# Altium footprint library ICs And Semiconductors THD.PcbLib: 507 footprints (part 6 of 32)
Each footprint in its own frame and in the unit in brackets; x right, y up, seen from the top. Pads: shape width x height; smd on the part's side, far side on the other; paste and mask are expansions set on the pad; w line width, h text height; cw(c..) or ccw(c..) is an arc to the next point about the centre after c.
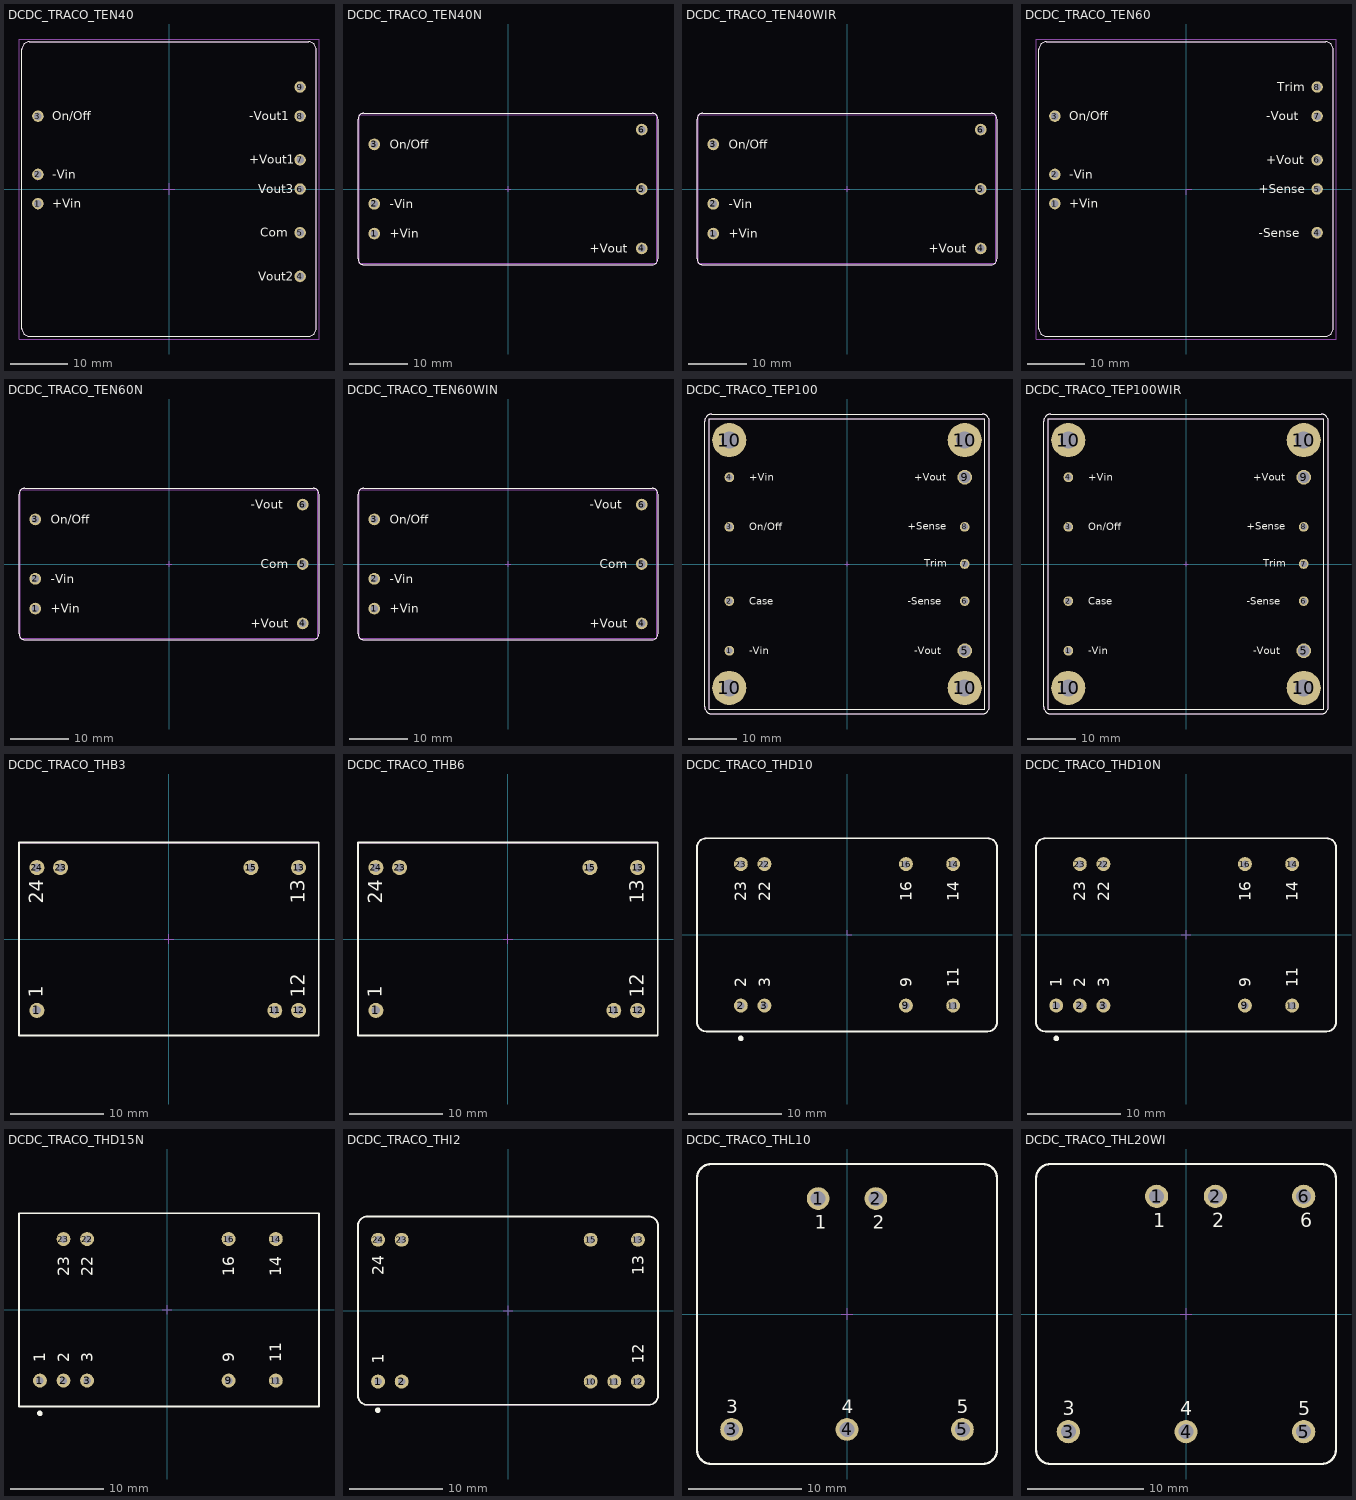
[diagram p5: the footprints below, top view; thin cyan lines are the x and y axes]

## DCDC_TRACO_TEN40 [mm] "TEN 40 Series , Body 51.3x51.3mm"
height 10.7
pads (9):
  round 2 hole 1.3: 1(-22.85,-2.54) 2(-22.85,2.54) 3(-22.85,12.7) 4(22.85,-15.24) 5(22.85,-7.62) 6(22.85,0) 7(22.85,5.08) 8(22.85,12.7) 9(22.85,17.78)
Top Overlay:
  lines w0.2: -25.65,-24.4 ccw(c-24.4,-24.4) -24.4,-25.65 24.4,-25.65 ccw(c24.4,-24.4) 25.65,-24.4 25.65,24.4 ccw(c24.4,24.4) 24.4,25.65 -24.4,25.65 ccw(c-24.4,24.4) -25.65,24.4 -25.65,-24.4
  text "+Vout1" at 13.95,4.4 h1.5
  text "On/Off" at -20.31,11.95 h1.5
  text "-Vin" at -20.31,1.79 h1.5
  text "+Vin" at -20.31,-3.29 h1.5
  text "Vout3" at 15.6,-0.7 h1.5
  text "Com" at 15.9,-8.3 h1.5
  text "-Vout1" at 13.96,11.95 h1.5
  text "Vout2" at 15.6,-16 h1.5
Notvisible:
  circle w0.05: c22.85,-15.24 r0.5
  circle w0.05: c-22.85,-2.54 r0.5
  circle w0.05: c-22.85,2.54 r0.5
  circle w0.05: c-22.85,12.7 r0.5
  circle w0.05: c22.85,17.78 r0.5
  circle w0.05: c22.85,12.7 r0.5
  circle w0.05: c22.85,5.08 r0.5
  circle w0.05: c22.85,0 r0.5
  circle w0.05: c22.85,-7.62 r0.5
  lines w0.05: -22.85,-3.54 -22.85,-2.54 -21.85,-2.54 ; -22.85,1.54 -22.85,2.54 -21.85,2.54 ; -22.85,11.7 -22.85,12.7 -21.85,12.7 ; 22.85,-16.24 22.85,-15.24 23.85,-15.24 ; 22.85,-8.62 22.85,-7.62 23.85,-7.62 ; 22.85,-1 22.85,0 23.85,0 ; 22.85,4.08 22.85,5.08 23.85,5.08 ; 22.85,11.7 22.85,12.7 23.85,12.7 ; 22.85,16.78 22.85,17.78 23.85,17.78
  lines w0.1: -1,0 0,0 ; 0,-1 0,0 ; 0,1 0,0 ; 1,0 0,0
  text "4" at 19.45,-15.74 h1
  text "5" at 19.479,-8.12 h1
  text "6" at 19.505,-0.5 h1
  text "7" at 19.5,4.58 h1
  text "9" at 19.483,17.28 h1
  text "8" at 19.5,12.2 h1
  text "3" at -20.221,12.2 h1
  text "2" at -20.217,2.04 h1
  text "1" at -20.1,-3.04 h1
Mechanical 14:
  lines w0.1: -25.65,-24.4 ccw(c-24.4,-24.4) -24.4,-25.65 24.4,-25.65 ccw(c24.4,-24.4) 25.65,-24.4 25.65,24.4 ccw(c24.4,24.4) 24.4,25.65 -24.4,25.65 ccw(c-24.4,24.4) -25.65,24.4 -25.65,-24.4
Mechanical 15:
  lines w0.05: -26.15,-26.15 -26.15,26.15 26.15,26.15 26.15,-26.15 -26.15,-26.15
3D body "DCDC_TRACO_TEN40.stp": height 10.7, standoff -3.8, extent -25.65,-25.65 25.65,25.65

## DCDC_TRACO_TEN40N [mm] "TEN 40N Series , Body 50.8x  25.4mm"
height 10.45
pads (6):
  round 2 hole 1.3: 1(-22.86,-7.62) 2(-22.86,-2.54) 3(-22.86,7.62) 4(22.86,-10.16) 5(22.86,0) 6(22.86,10.16)
Top Overlay:
  lines w0.2: -25.65,-11.95 ccw(c-24.65,-11.95) -24.65,-12.95 24.65,-12.95 ccw(c24.65,-11.95) 25.65,-11.95 25.65,11.95 ccw(c24.65,11.95) 24.65,12.95 -24.65,12.95 ccw(c-24.65,11.95) -25.65,11.95 -25.65,-11.95
  text "+Vin" at -20.193,-8.37 h1.5
  text "-Vin" at -20.193,-3.29 h1.5
  text "On/Off" at -20.193,6.87 h1.5
  text "+Vout" at 13.999,-10.91 h1.5
Notvisible:
  lines w0.1: -23.36,-7.62 -22.86,-7.62 ; -23.36,-2.54 -22.86,-2.54 ; -23.36,7.62 -22.86,7.62 ; -22.86,-8.12 -22.86,-7.62 ; -22.86,-7.12 -22.86,-7.62 ; -22.86,-3.04 -22.86,-2.54 ; -22.86,-2.04 -22.86,-2.54 ; -22.86,7.12 -22.86,7.62 ; -22.86,8.12 -22.86,7.62 ; -22.36,-7.62 -22.86,-7.62 ; -22.36,-2.54 -22.86,-2.54 ; -22.36,7.62 -22.86,7.62 ; -0.5,0 0,0 ; 0,-0.5 0,0 ; 0,0.5 0,0 ; 0.5,0 0,0 ; 22.36,-10.16 22.86,-10.16 ; 22.36,0 22.86,0 ; 22.36,10.16 22.86,10.16 ; 22.86,-10.66 22.86,-10.16 ; 22.86,-9.66 22.86,-10.16 ; 22.86,-0.5 22.86,0 ; 22.86,0.5 22.86,0 ; 22.86,9.66 22.86,10.16 ; 22.86,10.66 22.86,10.16 ; 23.36,-10.16 22.86,-10.16 ; 23.36,0 22.86,0 ; 23.36,10.16 22.86,10.16 ; -25.4,-12.7 -25.4,12.7 25.4,12.7 25.4,-12.7 -25.4,-12.7
Mechanical 14:
  lines w0.1: -25.65,-11.95 ccw(c-24.65,-11.95) -24.65,-12.95 24.65,-12.95 ccw(c24.65,-11.95) 25.65,-11.95 25.65,11.95 ccw(c24.65,11.95) 24.65,12.95 -24.65,12.95 ccw(c-24.65,11.95) -25.65,11.95 -25.65,-11.95
3D body "DCDC_TRACO_TEN40N.stp": height 10.45, standoff -3.8, extent -25.65,-12.95 25.65,12.95

## DCDC_TRACO_TEN40WIR [mm] "TEN 40WIR Series , Body 50.8 x  25.4mm"
height 10.7
pads (6):
  round 2 hole 1.3: 1(-22.86,-7.62) 2(-22.86,-2.54) 3(-22.86,7.62) 4(22.86,-10.16) 5(22.86,0) 6(22.86,10.16)
Top Overlay:
  lines w0.2: -25.65,-11.95 ccw(c-24.65,-11.95) -24.65,-12.95 24.65,-12.95 ccw(c24.65,-11.95) 25.65,-11.95 25.65,11.95 ccw(c24.65,11.95) 24.65,12.95 -24.65,12.95 ccw(c-24.65,11.95) -25.65,11.95 -25.65,-11.95
  text "+Vout" at 13.999,-10.91 h1.5
  text "On/Off" at -20.193,6.87 h1.5
  text "-Vin" at -20.193,-3.29 h1.5
  text "+Vin" at -20.193,-8.37 h1.5
Notvisible:
  lines w0.1: -23.36,-7.62 -22.86,-7.62 ; -23.36,-2.54 -22.86,-2.54 ; -23.36,7.62 -22.86,7.62 ; -22.86,-8.12 -22.86,-7.62 ; -22.86,-7.12 -22.86,-7.62 ; -22.86,-3.04 -22.86,-2.54 ; -22.86,-2.04 -22.86,-2.54 ; -22.86,7.12 -22.86,7.62 ; -22.86,8.12 -22.86,7.62 ; -22.36,-7.62 -22.86,-7.62 ; -22.36,-2.54 -22.86,-2.54 ; -22.36,7.62 -22.86,7.62 ; -0.5,0 0,0 ; 0,-0.5 0,0 ; 0,0.5 0,0 ; 0.5,0 0,0 ; 22.36,-10.16 22.86,-10.16 ; 22.36,0 22.86,0 ; 22.36,10.16 22.86,10.16 ; 22.86,-10.66 22.86,-10.16 ; 22.86,-9.66 22.86,-10.16 ; 22.86,-0.5 22.86,0 ; 22.86,0.5 22.86,0 ; 22.86,9.66 22.86,10.16 ; 22.86,10.66 22.86,10.16 ; 23.36,-10.16 22.86,-10.16 ; 23.36,0 22.86,0 ; 23.36,10.16 22.86,10.16 ; -25.4,-12.7 25.4,-12.7 25.4,12.7 -25.4,12.7 -25.4,-12.7
Mechanical 14:
  lines w0.1: -25.65,-11.95 ccw(c-24.65,-11.95) -24.65,-12.95 24.65,-12.95 ccw(c24.65,-11.95) 25.65,-11.95 25.65,11.95 ccw(c24.65,11.95) 24.65,12.95 -24.65,12.95 ccw(c-24.65,11.95) -25.65,11.95 -25.65,-11.95
3D body "DCDC_TRACO_TEN40WIR.stp": height 10.45, standoff -3.8, extent -25.65,-12.95 25.65,12.95

## DCDC_TRACO_TEN60 [mm] "TEN 60 Series , Body 51.3x51.3mm"
height 10.7
pads (8):
  round 2 hole 1.3: 1(-22.86,-2.54) 2(-22.86,2.54) 3(-22.86,12.7) 4(22.86,-7.62) 5(22.86,0) 6(22.86,5.08) 7(22.86,12.7) 8(22.86,17.78)
Top Overlay:
  lines w0.2: -25.65,-24.4 ccw(c-24.4,-24.4) -24.4,-25.65 24.4,-25.65 ccw(c24.4,-24.4) 25.65,-24.4 25.65,24.4 ccw(c24.4,24.4) 24.4,25.65 -24.4,25.65 ccw(c-24.4,24.4) -25.65,24.4 -25.65,-24.4
  text "Trim" at 15.875,17.03 h1.5
  text "-Vout" at 13.97,11.95 h1.5
  text "-Sense" at 12.7,-8.37 h1.5
  text "+Sense" at 12.7,-0.75 h1.5
  text "+Vin" at -20.32,-3.29 h1.5
  text "-Vin" at -20.32,1.79 h1.5
  text "On/Off" at -20.32,11.95 h1.5
  text "+Vout" at 13.97,4.33 h1.5
Notvisible:
  lines w0.1: 0,-1 0,0 1,0
Mechanical 14:
  lines w0.1: -25.65,-24.4 ccw(c-24.4,-24.4) -24.4,-25.65 24.4,-25.65 ccw(c24.4,-24.4) 25.65,-24.4 25.65,24.4 ccw(c24.4,24.4) 24.4,25.65 -24.4,25.65 ccw(c-24.4,24.4) -25.65,24.4 -25.65,-24.4
Mechanical 15:
  lines w0.05: -26.15,-26.15 26.15,-26.15 26.15,26.15 -26.15,26.15 -26.15,-26.15
3D body "DCDC_TRACO_TEN60.stp": height 10.7, standoff -3.8, extent -25.65,-25.65 25.65,25.65

## DCDC_TRACO_TEN60N [mm] "TEN 60N Series , Body 51.3x25.9mm"
height 10.7
pads (6):
  round 2 hole 1.3: 1(-22.86,-7.62) 2(-22.86,-2.54) 3(-22.86,7.62) 4(22.86,-10.16) 5(22.86,0) 6(22.86,10.16)
Top Overlay:
  lines w0.2: -25.65,-11.95 ccw(c-24.65,-11.95) -24.65,-12.95 24.65,-12.95 ccw(c24.65,-11.95) 25.65,-11.95 25.65,11.95 ccw(c24.65,11.95) 24.65,12.95 -24.65,12.95 ccw(c-24.65,11.95) -25.65,11.95 -25.65,-11.95
  text "Com" at 15.699,-0.75 h1.5
  text "+Vin" at -20.193,-8.37 h1.5
  text "-Vin" at -20.193,-3.29 h1.5
  text "On/Off" at -20.193,6.87 h1.5
  text "+Vout" at 13.999,-10.91 h1.5
  text "-Vout" at 13.999,9.41 h1.5
Notvisible:
  lines w0.1: -23.36,-7.62 -22.86,-7.62 ; -23.36,-2.54 -22.86,-2.54 ; -23.36,7.62 -22.86,7.62 ; -22.86,-8.12 -22.86,-7.62 ; -22.86,-7.12 -22.86,-7.62 ; -22.86,-3.04 -22.86,-2.54 ; -22.86,-2.04 -22.86,-2.54 ; -22.86,7.12 -22.86,7.62 ; -22.86,8.12 -22.86,7.62 ; -22.36,-7.62 -22.86,-7.62 ; -22.36,-2.54 -22.86,-2.54 ; -22.36,7.62 -22.86,7.62 ; -0.5,0 0,0 ; 0,-0.5 0,0 ; 0,0.5 0,0 ; 0.5,0 0,0 ; 22.36,-10.16 22.86,-10.16 ; 22.36,0 22.86,0 ; 22.36,10.16 22.86,10.16 ; 22.86,-10.66 22.86,-10.16 ; 22.86,-9.66 22.86,-10.16 ; 22.86,-0.5 22.86,0 ; 22.86,0.5 22.86,0 ; 22.86,9.66 22.86,10.16 ; 22.86,10.66 22.86,10.16 ; 23.36,-10.16 22.86,-10.16 ; 23.36,0 22.86,0 ; 23.36,10.16 22.86,10.16 ; -25.4,-12.7 -25.4,12.7 25.4,12.7 25.4,-12.7 -25.4,-12.7
Mechanical 14:
  lines w0.1: -25.65,-11.95 ccw(c-24.65,-11.95) -24.65,-12.95 24.65,-12.95 ccw(c24.65,-11.95) 25.65,-11.95 25.65,11.95 ccw(c24.65,11.95) 24.65,12.95 -24.65,12.95 ccw(c-24.65,11.95) -25.65,11.95 -25.65,-11.95
3D body "DCDC_TRACO_TEN60N.stp": height 10.7, standoff -3.8, extent -25.65,-12.95 25.65,12.95

## DCDC_TRACO_TEN60WIN [mm] "TEN 60N Series , Body 51.3x25.9mm"
height 10.7
pads (6):
  round 2 hole 1.3: 1(-22.86,-7.62) 2(-22.86,-2.54) 3(-22.86,7.62) 4(22.86,-10.16) 5(22.86,0) 6(22.86,10.16)
Top Overlay:
  lines w0.2: -25.65,-11.95 ccw(c-24.65,-11.95) -24.65,-12.95 24.65,-12.95 ccw(c24.65,-11.95) 25.65,-11.95 25.65,11.95 ccw(c24.65,11.95) 24.65,12.95 -24.65,12.95 ccw(c-24.65,11.95) -25.65,11.95 -25.65,-11.95
  text "Com" at 15.699,-0.75 h1.5
  text "+Vin" at -20.193,-8.37 h1.5
  text "-Vin" at -20.193,-3.29 h1.5
  text "On/Off" at -20.193,6.87 h1.5
  text "+Vout" at 13.999,-10.91 h1.5
  text "-Vout" at 13.999,9.41 h1.5
Notvisible:
  lines w0.1: -23.36,-7.62 -22.86,-7.62 ; -23.36,-2.54 -22.86,-2.54 ; -23.36,7.62 -22.86,7.62 ; -22.86,-8.12 -22.86,-7.62 ; -22.86,-7.12 -22.86,-7.62 ; -22.86,-3.04 -22.86,-2.54 ; -22.86,-2.04 -22.86,-2.54 ; -22.86,7.12 -22.86,7.62 ; -22.86,8.12 -22.86,7.62 ; -22.36,-7.62 -22.86,-7.62 ; -22.36,-2.54 -22.86,-2.54 ; -22.36,7.62 -22.86,7.62 ; -0.5,0 0,0 ; 0,-0.5 0,0 ; 0,0.5 0,0 ; 0.5,0 0,0 ; 22.36,-10.16 22.86,-10.16 ; 22.36,0 22.86,0 ; 22.36,10.16 22.86,10.16 ; 22.86,-10.66 22.86,-10.16 ; 22.86,-9.66 22.86,-10.16 ; 22.86,-0.5 22.86,0 ; 22.86,0.5 22.86,0 ; 22.86,9.66 22.86,10.16 ; 22.86,10.66 22.86,10.16 ; 23.36,-10.16 22.86,-10.16 ; 23.36,0 22.86,0 ; 23.36,10.16 22.86,10.16 ; -25.4,-12.7 -25.4,12.7 25.4,12.7 25.4,-12.7 -25.4,-12.7
Mechanical 14:
  lines w0.1: -25.65,-11.95 ccw(c-24.65,-11.95) -24.65,-12.95 24.65,-12.95 ccw(c24.65,-11.95) 25.65,-11.95 25.65,11.95 ccw(c24.65,11.95) 24.65,12.95 -24.65,12.95 ccw(c-24.65,11.95) -25.65,11.95 -25.65,-11.95
3D body "DCDC_TRACO_TEN60N.stp": height 10.7, standoff -3.8, extent -25.65,-12.95 25.65,12.95

## DCDC_TRACO_TEP100 [mm] "TEP 100 Series, Single Output DC/DC Converter,  Body 61.5x58.2mm"
height 13.2
pads (13):
  round 2 hole 1.3: 1(-24.13,-17.78) 2(-24.13,-7.62) 3(-24.13,7.62) 4(-24.13,17.78) 6(24.13,-7.62) 7(24.13,0) 8(24.13,7.62)
  round 3 hole 2.3: 5(24.13,-17.78) 9(24.13,17.78)
  round 7 hole 3.5: 10(-24.13,-25.4) 10(-24.13,25.4) 10(24.13,-25.4) 10(24.13,25.4)
Top Overlay:
  lines w0.2: -29.2,-29.25 ccw(c-27.7,-29.25) -27.7,-30.75 27.7,-30.75 ccw(c27.7,-29.25) 29.2,-29.25 29.2,29.25 ccw(c27.7,29.25) 27.7,30.75 -27.7,30.75 ccw(c-27.7,29.25) -29.2,29.25 -29.2,-29.25 ; -28.2,-29.75 28.2,-29.75 28.2,29.75 -28.2,29.75 -28.2,-29.75
  text "Trim" at 15.8,-0.55 h1.5
  text "-Vout" at 13.8,-18.53 h1.5
  text "-Sense" at 12.5,-8.37 h1.5
  text "+Sense" at 12.5,7.07 h1.5
  text "+Vin" at -20,17.03 h1.5
  text "-Vin" at -20,-18.53 h1.5
  text "On/Off" at -20,6.87 h1.5
  text "+Vout" at 13.8,17.03 h1.5
  text "Case" at -20,-8.37 h1.5
Notvisible:
  circle w0.1: c-24.13,-17.78 r0.65
  circle w0.1: c-24.13,-7.62 r0.65
  circle w0.1: c-24.13,7.62 r0.65
  circle w0.1: c-24.13,17.78 r0.65
  circle w0.1: c24.13,7.62 r0.65
  circle w0.1: c24.13,0 r0.65
  circle w0.1: c24.13,-7.62 r0.65
  circle w0.1: c24.13,-17.78 r1.15
  circle w0.1: c24.13,17.78 r1.15
  circle w0.1: c-24.13,-25.4 r1.75
  circle w0.1: c24.13,-25.4 r1.75
  circle w0.1: c24.13,25.4 r1.75
  circle w0.1: c-24.13,25.4 r1.75
  lines w0.1: -24.63,-25.4 -24.13,-25.4 ; -24.63,-17.78 -24.13,-17.78 ; -24.63,-7.62 -24.13,-7.62 ; -24.63,7.62 -24.13,7.62 ; -24.63,17.78 -24.13,17.78 ; -24.63,25.4 -24.13,25.4 ; -24.13,-25.9 -24.13,-25.4 ; -24.13,-24.9 -24.13,-25.4 ; -24.13,-18.28 -24.13,-17.78 ; -24.13,-17.28 -24.13,-17.78 ; -24.13,-8.12 -24.13,-7.62 ; -24.13,-7.12 -24.13,-7.62 ; -24.13,7.12 -24.13,7.62 ; -24.13,8.12 -24.13,7.62 ; -24.13,17.28 -24.13,17.78 ; -24.13,18.28 -24.13,17.78 ; -24.13,24.9 -24.13,25.4 ; -24.13,25.9 -24.13,25.4 ; -23.63,-25.4 -24.13,-25.4 ; -23.63,-17.78 -24.13,-17.78 ; -23.63,-7.62 -24.13,-7.62 ; -23.63,7.62 -24.13,7.62 ; -23.63,17.78 -24.13,17.78 ; -23.63,25.4 -24.13,25.4 ; -0.5,0 0,0 ; 0,-0.5 0,0 ; 0,0.5 0,0 ; 0.5,0 0,0 ; 23.63,-25.4 24.13,-25.4 ; 23.63,-17.78 24.13,-17.78 ; 23.63,-7.62 24.13,-7.62 ; 23.63,0 24.13,0 ; 23.63,7.62 24.13,7.62 ; 23.63,17.78 24.13,17.78 ; 23.63,25.4 24.13,25.4 ; 24.13,-25.9 24.13,-25.4 ; 24.13,-24.9 24.13,-25.4 ; 24.13,-18.28 24.13,-17.78 ; 24.13,-17.28 24.13,-17.78 ; 24.13,-8.12 24.13,-7.62 ; 24.13,-7.12 24.13,-7.62 ; 24.13,-0.5 24.13,0 ; 24.13,0.5 24.13,0 ; 24.13,7.12 24.13,7.62 ; 24.13,8.12 24.13,7.62 ; 24.13,17.28 24.13,17.78 ; 24.13,18.28 24.13,17.78 ; 24.13,24.9 24.13,25.4 ; 24.13,25.9 24.13,25.4 ; 24.63,-25.4 24.13,-25.4 ; 24.63,-17.78 24.13,-17.78 ; 24.63,-7.62 24.13,-7.62 ; 24.63,0 24.13,0 ; 24.63,7.62 24.13,7.62 ; 24.63,17.78 24.13,17.78 ; 24.63,25.4 24.13,25.4
Mechanical 14:
  lines w0.1: -29.2,-29.25 ccw(c-27.7,-29.25) -27.7,-30.75 27.7,-30.75 ccw(c27.7,-29.25) 29.2,-29.25 29.2,29.25 ccw(c27.7,29.25) 27.7,30.75 -27.7,30.75 ccw(c-27.7,29.25) -29.2,29.25 -29.2,-29.25 ; -28.2,-29.75 28.2,-29.75 28.2,29.75 -28.2,29.75 -28.2,-29.75
3D body "DCDC_TRACO_TEP100.stp": height 12.7, standoff -5.1, extent -29.2,-30.75 29.2,30.75

## DCDC_TRACO_TEP100WIR [mm] "TEP 100WIR Series, Single Output DC/DC Converter,  Body 61.5x58.2mm"
height 13.2
pads (13):
  round 2 hole 1.3: 1(-24.13,-17.78) 2(-24.13,-7.62) 3(-24.13,7.62) 4(-24.13,17.78) 6(24.13,-7.62) 7(24.13,0) 8(24.13,7.62)
  round 3 hole 2.3: 5(24.13,-17.78) 9(24.13,17.78)
  round 7 hole 3.5: 10(-24.13,-25.4) 10(-24.13,25.4) 10(24.13,-25.4) 10(24.13,25.4)
Top Overlay:
  lines w0.2: -29.2,-29.25 ccw(c-27.7,-29.25) -27.7,-30.75 27.7,-30.75 ccw(c27.7,-29.25) 29.2,-29.25 29.2,29.25 ccw(c27.7,29.25) 27.7,30.75 -27.7,30.75 ccw(c-27.7,29.25) -29.2,29.25 -29.2,-29.25 ; -28.2,-29.75 28.2,-29.75 28.2,29.75 -28.2,29.75 -28.2,-29.75
  text "Trim" at 15.8,-0.55 h1.5
  text "-Vout" at 13.8,-18.53 h1.5
  text "-Sense" at 12.5,-8.37 h1.5
  text "+Sense" at 12.5,7.07 h1.5
  text "+Vin" at -20,17.03 h1.5
  text "-Vin" at -20,-18.53 h1.5
  text "On/Off" at -20,6.87 h1.5
  text "+Vout" at 13.8,17.03 h1.5
  text "Case" at -20,-8.37 h1.5
Notvisible:
  circle w0.1: c-24.13,-17.78 r0.65
  circle w0.1: c-24.13,-7.62 r0.65
  circle w0.1: c-24.13,7.62 r0.65
  circle w0.1: c-24.13,17.78 r0.65
  circle w0.1: c24.13,7.62 r0.65
  circle w0.1: c24.13,0 r0.65
  circle w0.1: c24.13,-7.62 r0.65
  circle w0.1: c24.13,-17.78 r1.15
  circle w0.1: c24.13,17.78 r1.15
  circle w0.1: c-24.13,-25.4 r1.75
  circle w0.1: c24.13,-25.4 r1.75
  circle w0.1: c24.13,25.4 r1.75
  circle w0.1: c-24.13,25.4 r1.75
  lines w0.1: -24.63,-25.4 -24.13,-25.4 ; -24.63,-17.78 -24.13,-17.78 ; -24.63,-7.62 -24.13,-7.62 ; -24.63,7.62 -24.13,7.62 ; -24.63,17.78 -24.13,17.78 ; -24.63,25.4 -24.13,25.4 ; -24.13,-25.9 -24.13,-25.4 ; -24.13,-24.9 -24.13,-25.4 ; -24.13,-18.28 -24.13,-17.78 ; -24.13,-17.28 -24.13,-17.78 ; -24.13,-8.12 -24.13,-7.62 ; -24.13,-7.12 -24.13,-7.62 ; -24.13,7.12 -24.13,7.62 ; -24.13,8.12 -24.13,7.62 ; -24.13,17.28 -24.13,17.78 ; -24.13,18.28 -24.13,17.78 ; -24.13,24.9 -24.13,25.4 ; -24.13,25.9 -24.13,25.4 ; -23.63,-25.4 -24.13,-25.4 ; -23.63,-17.78 -24.13,-17.78 ; -23.63,-7.62 -24.13,-7.62 ; -23.63,7.62 -24.13,7.62 ; -23.63,17.78 -24.13,17.78 ; -23.63,25.4 -24.13,25.4 ; -0.5,0 0,0 ; 0,-0.5 0,0 ; 0,0.5 0,0 ; 0.5,0 0,0 ; 23.63,-25.4 24.13,-25.4 ; 23.63,-17.78 24.13,-17.78 ; 23.63,-7.62 24.13,-7.62 ; 23.63,0 24.13,0 ; 23.63,7.62 24.13,7.62 ; 23.63,17.78 24.13,17.78 ; 23.63,25.4 24.13,25.4 ; 24.13,-25.9 24.13,-25.4 ; 24.13,-24.9 24.13,-25.4 ; 24.13,-18.28 24.13,-17.78 ; 24.13,-17.28 24.13,-17.78 ; 24.13,-8.12 24.13,-7.62 ; 24.13,-7.12 24.13,-7.62 ; 24.13,-0.5 24.13,0 ; 24.13,0.5 24.13,0 ; 24.13,7.12 24.13,7.62 ; 24.13,8.12 24.13,7.62 ; 24.13,17.28 24.13,17.78 ; 24.13,18.28 24.13,17.78 ; 24.13,24.9 24.13,25.4 ; 24.13,25.9 24.13,25.4 ; 24.63,-25.4 24.13,-25.4 ; 24.63,-17.78 24.13,-17.78 ; 24.63,-7.62 24.13,-7.62 ; 24.63,0 24.13,0 ; 24.63,7.62 24.13,7.62 ; 24.63,17.78 24.13,17.78 ; 24.63,25.4 24.13,25.4
Mechanical 14:
  lines w0.1: -29.2,-29.25 ccw(c-27.7,-29.25) -27.7,-30.75 27.7,-30.75 ccw(c27.7,-29.25) 29.2,-29.25 29.2,29.25 ccw(c27.7,29.25) 27.7,30.75 -27.7,30.75 ccw(c-27.7,29.25) -29.2,29.25 -29.2,-29.25 ; -28.2,-29.75 28.2,-29.75 28.2,29.75 -28.2,29.75 -28.2,-29.75
3D body "DCDC_TRACO_TEP100WIR.stp": height 12.7, standoff -5.1, extent -29.2,-30.75 29.2,30.75

## DCDC_TRACO_THB3 [mm] "THB 3 Series , Body 31.8x20.3mm"
height 10.75
pads (7):
  round 1.6 hole 0.9: 1(-14.097,-7.62) 11(11.303,-7.62) 12(13.843,-7.62) 13(13.843,7.62) 15(8.763,7.62) 23(-11.557,7.62) 24(-14.097,7.62)
Top Overlay:
  lines w0.2: -16,-10.285 -16,10.285 16,10.285 16,-10.285 -16,-10.285
  text "1" at -13.447,-6.251 h1.5
  text "12" at 14.493,-6.251 h1.5
  text "13" at 14.523,3.769 h1.5
  text "24" at -13.417,3.769 h1.5
Notvisible:
  lines w0.1: -14.597,-7.62 -14.097,-7.62 ; -14.597,7.62 -14.097,7.62 ; -14.097,-8.12 -14.097,-7.62 ; -14.097,-7.12 -14.097,-7.62 ; -14.097,7.12 -14.097,7.62 ; -14.097,8.12 -14.097,7.62 ; -13.597,-7.62 -14.097,-7.62 ; -13.597,7.62 -14.097,7.62 ; -12.057,7.62 -11.557,7.62 ; -11.557,7.12 -11.557,7.62 ; -11.557,8.12 -11.557,7.62 ; -11.057,7.62 -11.557,7.62 ; -0.5,0 0,0 ; 0,-0.5 0,0 ; 0,0.5 0,0 ; 0.5,0 0,0 ; 8.263,7.62 8.763,7.62 ; 8.763,7.12 8.763,7.62 ; 8.763,8.12 8.763,7.62 ; 9.263,7.62 8.763,7.62 ; 10.803,-7.62 11.303,-7.62 ; 11.303,-8.12 11.303,-7.62 ; 11.303,-7.12 11.303,-7.62 ; 11.803,-7.62 11.303,-7.62 ; 13.343,-7.62 13.843,-7.62 ; 13.343,7.62 13.843,7.62 ; 13.843,-8.12 13.843,-7.62 ; 13.843,-7.12 13.843,-7.62 ; 13.843,7.12 13.843,7.62 ; 13.843,8.12 13.843,7.62 ; 14.343,-7.62 13.843,-7.62 ; 14.343,7.62 13.843,7.62
Mechanical 14:
  lines w0.1: -16,-10.285 -16,10.285 16,10.285 16,-10.285 -16,-10.285
  text "1" at -13.447,-6.251 h1.5
  text "12" at 14.493,-6.251 h1.5
  text "13" at 14.523,3.769 h1.5
  text "24" at -13.417,3.769 h1.5
3D body "DCDC_TRACO_THB3.stp": height 10.95, standoff -3.9, extent -16,-10.285 16,10.285

## DCDC_TRACO_THB6 [mm] "THB 6 Series , Body 31.8x20.3mm"
height 12
pads (7):
  round 1.6 hole 0.9: 1(-14.097,-7.62) 11(11.303,-7.62) 12(13.843,-7.62) 13(13.843,7.62) 15(8.763,7.62) 23(-11.557,7.62) 24(-14.097,7.62)
Top Overlay:
  lines w0.2: -16,-10.285 -16,10.285 16,10.285 16,-10.285 -16,-10.285
  text "1" at -13.447,-6.251 h1.5
  text "12" at 14.493,-6.251 h1.5
  text "13" at 14.523,3.769 h1.5
  text "24" at -13.417,3.769 h1.5
Notvisible:
  lines w0.1: -14.597,-7.62 -14.097,-7.62 ; -14.597,7.62 -14.097,7.62 ; -14.097,-8.12 -14.097,-7.62 ; -14.097,-7.12 -14.097,-7.62 ; -14.097,7.12 -14.097,7.62 ; -14.097,8.12 -14.097,7.62 ; -13.597,-7.62 -14.097,-7.62 ; -13.597,7.62 -14.097,7.62 ; -12.057,7.62 -11.557,7.62 ; -11.557,7.12 -11.557,7.62 ; -11.557,8.12 -11.557,7.62 ; -11.057,7.62 -11.557,7.62 ; -0.5,0 0,0 ; 0,-0.5 0,0 ; 0,0.5 0,0 ; 0.5,0 0,0 ; 8.263,7.62 8.763,7.62 ; 8.763,7.12 8.763,7.62 ; 8.763,8.12 8.763,7.62 ; 9.263,7.62 8.763,7.62 ; 10.803,-7.62 11.303,-7.62 ; 11.303,-8.12 11.303,-7.62 ; 11.303,-7.12 11.303,-7.62 ; 11.803,-7.62 11.303,-7.62 ; 13.343,-7.62 13.843,-7.62 ; 13.343,7.62 13.843,7.62 ; 13.843,-8.12 13.843,-7.62 ; 13.843,-7.12 13.843,-7.62 ; 13.843,7.12 13.843,7.62 ; 13.843,8.12 13.843,7.62 ; 14.343,-7.62 13.843,-7.62 ; 14.343,7.62 13.843,7.62
Mechanical 14:
  lines w0.1: -16,-10.285 -16,10.285 16,10.285 16,-10.285 -16,-10.285
  text "1" at -13.447,-6.251 h1.5
  text "12" at 14.493,-6.251 h1.5
  text "13" at 14.523,3.769 h1.5
  text "24" at -13.417,3.769 h1.5
3D body "DCDC_TRACO_THB6.stp": height 12.02, standoff -3.8, extent -15.85,-10.1 15.85,10.1

## DCDC_TRACO_THD10 [mm] "THD 10 Series, Body 32.3x20.8mm, Height 10.7mm"
height 10.7
pads (8):
  round 1.5 hole 0.8: 2(-11.43,-7.62) 3(-8.89,-7.62) 9(6.35,-7.62) 11(11.43,-7.62) 14(11.43,7.62) 16(6.35,7.62) 22(-8.89,7.62) 23(-11.43,7.62)
Top Overlay:
  circle w0.3: c-11.43,-11.15 r0.15
  lines w0.2: -16.15,-9.4 ccw(c-15.15,-9.4) -15.15,-10.4 15.15,-10.4 ccw(c15.15,-9.4) 16.15,-9.4 16.15,9.4 ccw(c15.15,9.4) 15.15,10.4 -15.15,10.4 ccw(c-15.15,9.4) -16.15,9.4 -16.15,-9.4
  text "2" at -10.83,-5.62 h1.2
  text "3" at -8.29,-5.62 h1.2
  text "9" at 6.95,-5.62 h1.2
  text "11" at 12.03,-5.62 h1.2
  text "14" at 12.03,3.62 h1.2
  text "16" at 6.95,3.62 h1.2
  text "22" at -8.29,3.62 h1.2
  text "23" at -10.83,3.62 h1.2
Notvisible:
  lines w0.05: -11.43,-7.12 -11.43,-7.62 -10.93,-7.62 ; -11.43,8.12 -11.43,7.62 -10.93,7.62 ; -8.89,-7.12 -8.89,-7.62 -8.39,-7.62 ; -8.89,8.12 -8.89,7.62 -8.39,7.62 ; 0,0.5 0,0 0.5,0 ; 6.35,-7.12 6.35,-7.62 6.85,-7.62 ; 6.35,8.12 6.35,7.62 6.85,7.62 ; 11.43,-7.12 11.43,-7.62 11.93,-7.62 ; 11.43,8.12 11.43,7.62 11.93,7.62
Mechanical 14:
  lines w0.1: -16.15,-9.4 ccw(c-15.15,-9.4) -15.15,-10.4 15.15,-10.4 ccw(c15.15,-9.4) 16.15,-9.4 16.15,9.4 ccw(c15.15,9.4) 15.15,10.4 -15.15,10.4 ccw(c-15.15,9.4) -16.15,9.4 -16.15,-9.4
  text "2" at -10.83,-5.62 h1.2
  text "3" at -8.29,-5.62 h1.2
  text "9" at 6.95,-5.62 h1.2
  text "11" at 12.03,-5.62 h1.2
  text "14" at 12.03,3.62 h1.2
  text "16" at 6.95,3.62 h1.2
  text "22" at -8.29,3.62 h1.2
  text "23" at -10.83,3.62 h1.2
3D body "DCDC_TRACO_THD10.stp": height 10.7, standoff -4.1, extent -16.15,-10.4 16.15,10.4

## DCDC_TRACO_THD10N [mm] "THD 10 N Series, Body 32.3x20.8mm, Height 10.7mm"
height 10.7
pads (9):
  round 1.5 hole 0.8: 1(-13.97,-7.62) 2(-11.43,-7.62) 3(-8.89,-7.62) 9(6.35,-7.62) 11(11.43,-7.62) 14(11.43,7.62) 16(6.35,7.62) 22(-8.89,7.62) 23(-11.43,7.62)
Top Overlay:
  circle w0.3: c-13.97,-11.15 r0.15
  lines w0.2: -16.15,-9.4 ccw(c-15.15,-9.4) -15.15,-10.4 15.15,-10.4 ccw(c15.15,-9.4) 16.15,-9.4 16.15,9.4 ccw(c15.15,9.4) 15.15,10.4 -15.15,10.4 ccw(c-15.15,9.4) -16.15,9.4 -16.15,-9.4
  text "1" at -13.37,-5.62 h1.2
  text "2" at -10.83,-5.62 h1.2
  text "3" at -8.29,-5.62 h1.2
  text "9" at 6.95,-5.62 h1.2
  text "11" at 12.03,-5.62 h1.2
  text "14" at 12.03,3.62 h1.2
  text "16" at 6.95,3.62 h1.2
  text "22" at -8.29,3.62 h1.2
  text "23" at -10.83,3.62 h1.2
Notvisible:
  lines w0.1: -14.47,-7.62 -13.97,-7.62 ; -13.97,-8.12 -13.97,-7.62 ; -13.97,-7.12 -13.97,-7.62 ; -13.47,-7.62 -13.97,-7.62 ; -11.93,-7.62 -11.43,-7.62 ; -11.93,7.62 -11.43,7.62 ; -11.43,-8.12 -11.43,-7.62 ; -11.43,-7.12 -11.43,-7.62 ; -11.43,7.12 -11.43,7.62 ; -11.43,8.12 -11.43,7.62 ; -10.93,-7.62 -11.43,-7.62 ; -10.93,7.62 -11.43,7.62 ; -9.39,-7.62 -8.89,-7.62 ; -9.39,7.62 -8.89,7.62 ; -8.89,-8.12 -8.89,-7.62 ; -8.89,-7.12 -8.89,-7.62 ; -8.89,7.12 -8.89,7.62 ; -8.89,8.12 -8.89,7.62 ; -8.39,-7.62 -8.89,-7.62 ; -8.39,7.62 -8.89,7.62 ; -0.5,0 0,0 ; 0,-0.5 0,0 ; 0,0.5 0,0 ; 0.5,0 0,0 ; 5.85,-7.62 6.35,-7.62 ; 5.85,7.62 6.35,7.62 ; 6.35,-8.12 6.35,-7.62 ; 6.35,-7.12 6.35,-7.62 ; 6.35,7.12 6.35,7.62 ; 6.35,8.12 6.35,7.62 ; 6.85,-7.62 6.35,-7.62 ; 6.85,7.62 6.35,7.62 ; 10.93,-7.62 11.43,-7.62 ; 10.93,7.62 11.43,7.62 ; 11.43,-8.12 11.43,-7.62 ; 11.43,-7.12 11.43,-7.62 ; 11.43,7.12 11.43,7.62 ; 11.43,8.12 11.43,7.62 ; 11.93,-7.62 11.43,-7.62 ; 11.93,7.62 11.43,7.62
Mechanical 14:
  lines w0.1: -16.15,-9.4 ccw(c-15.15,-9.4) -15.15,-10.4 15.15,-10.4 ccw(c15.15,-9.4) 16.15,-9.4 16.15,9.4 ccw(c15.15,9.4) 15.15,10.4 -15.15,10.4 ccw(c-15.15,9.4) -16.15,9.4 -16.15,-9.4
  text "1" at -13.37,-5.62 h1.2
  text "2" at -10.83,-5.62 h1.2
  text "3" at -8.29,-5.62 h1.2
  text "9" at 6.95,-5.62 h1.2
  text "11" at 12.03,-5.62 h1.2
  text "14" at 12.03,3.62 h1.2
  text "16" at 6.95,3.62 h1.2
  text "22" at -8.29,3.62 h1.2
  text "23" at -10.83,3.62 h1.2
3D body "DCDC_TRACO_THD10N.stp": height 10.7, standoff -4.1, extent -16.15,-10.4 16.15,10.4

## DCDC_TRACO_THD15N [mm] "THD 15N Series, Body 22.3x20.8mm, Height 10.7mm"
height 10.7
pads (9):
  round 1.5 hole 0.8: 1(-13.699,-7.62) 2(-11.159,-7.62) 3(-8.619,-7.62) 9(6.621,-7.62) 11(11.701,-7.62) 14(11.701,7.62) 16(6.621,7.62) 22(-8.619,7.62) 23(-11.159,7.62)
Top Overlay:
  circle w0.3: c-13.699,-11.15 r0.15
  lines w0.2: -15.949,-10.4 -15.949,10.4 16.351,10.4 16.351,-10.4 -15.949,-10.4
  text "2" at -10.559,-5.62 h1.2
  text "3" at -8.019,-5.62 h1.2
  text "9" at 7.221,-5.62 h1.2
  text "11" at 12.301,-5.62 h1.2
  text "14" at 12.301,3.62 h1.2
  text "16" at 7.221,3.62 h1.2
  text "22" at -8.019,3.62 h1.2
  text "23" at -10.559,3.62 h1.2
  text "1" at -13.099,-5.62 h1.2
Notvisible:
  lines w0.05: -14.199,-7.62 -13.699,-7.62 ; -13.699,-8.12 -13.699,-7.62 ; -13.699,-7.12 -13.699,-7.62 ; -13.199,-7.62 -13.699,-7.62 ; -11.659,-7.62 -11.159,-7.62 ; -11.659,7.62 -11.159,7.62 ; -11.159,-8.12 -11.159,-7.62 ; -11.159,-7.12 -11.159,-7.62 ; -11.159,7.12 -11.159,7.62 ; -11.159,8.12 -11.159,7.62 ; -10.659,-7.62 -11.159,-7.62 ; -10.659,7.62 -11.159,7.62 ; -9.119,-7.62 -8.619,-7.62 ; -9.119,7.62 -8.619,7.62 ; -8.619,-8.12 -8.619,-7.62 ; -8.619,-7.12 -8.619,-7.62 ; -8.619,7.12 -8.619,7.62 ; -8.619,8.12 -8.619,7.62 ; -8.119,-7.62 -8.619,-7.62 ; -8.119,7.62 -8.619,7.62 ; -0.5,0 0,0 ; 0,-0.5 0,0 ; 0,0.5 0,0 ; 0.5,0 0,0 ; 6.121,-7.62 6.621,-7.62 ; 6.121,7.62 6.621,7.62 ; 6.621,-8.12 6.621,-7.62 ; 6.621,-7.12 6.621,-7.62 ; 6.621,7.12 6.621,7.62 ; 6.621,8.12 6.621,7.62 ; 7.121,-7.62 6.621,-7.62 ; 7.121,7.62 6.621,7.62 ; 11.201,-7.62 11.701,-7.62 ; 11.201,7.62 11.701,7.62 ; 11.701,-8.12 11.701,-7.62 ; 11.701,-7.12 11.701,-7.62 ; 11.701,7.12 11.701,7.62 ; 11.701,8.12 11.701,7.62 ; 12.201,-7.62 11.701,-7.62 ; 12.201,7.62 11.701,7.62
Mechanical 14:
  lines w0.1: -15.949,-10.4 -15.949,10.4 16.351,10.4 16.351,-10.4 -15.949,-10.4
  text "2" at -10.559,-5.62 h1.2
  text "3" at -8.019,-5.62 h1.2
  text "9" at 7.221,-5.62 h1.2
  text "11" at 12.301,-5.62 h1.2
  text "14" at 12.301,3.62 h1.2
  text "16" at 7.221,3.62 h1.2
  text "22" at -8.019,3.62 h1.2
  text "23" at -10.559,3.62 h1.2
  text "1" at -13.099,-5.62 h1.2
3D body "DCDC_TRACO_THD15N.stp": height 10.7, standoff -3.8, extent -15.948,-10.4 16.352,10.4

## DCDC_TRACO_THI2 [mm] "THI Series , Body 32x20mm, Pitch 2.54mm"
height 10.25
pads (9):
  round 1.5 hole 0.8: 1(-13.97,-7.62) 2(-11.43,-7.62) 10(8.89,-7.62) 11(11.43,-7.62) 12(13.97,-7.62) 13(13.97,7.62) 15(8.89,7.62) 23(-11.43,7.62) 24(-13.97,7.62)
Top Overlay:
  circle w0.3: c-14,-10.7 r0.15
  lines w0.2: -16.125,-9.125 ccw(c-15.125,-9.125) -15.125,-10.125 15.125,-10.125 ccw(c15.125,-9.125) 16.125,-9.125 16.125,9.125 ccw(c15.125,9.125) 15.125,10.125 -15.125,10.125 ccw(c-15.125,9.125) -16.125,9.125 -16.125,-9.125
  text "12" at 14.605,-5.715 h1.2
  text "24" at -13.335,3.81 h1.2
  text "13" at 14.605,3.81 h1.2
  text "1" at -13.335,-5.715 h1.2
Notvisible:
  lines w0.1: -14.47,-7.62 -13.97,-7.62 ; -14.47,7.62 -13.97,7.62 ; -13.97,-8.12 -13.97,-7.62 ; -13.97,-7.12 -13.97,-7.62 ; -13.97,7.12 -13.97,7.62 ; -13.97,8.12 -13.97,7.62 ; -13.47,-7.62 -13.97,-7.62 ; -13.47,7.62 -13.97,7.62 ; -11.93,-7.62 -11.43,-7.62 ; -11.93,7.62 -11.43,7.62 ; -11.43,-8.12 -11.43,-7.62 ; -11.43,-7.12 -11.43,-7.62 ; -11.43,7.12 -11.43,7.62 ; -11.43,8.12 -11.43,7.62 ; -10.93,-7.62 -11.43,-7.62 ; -10.93,7.62 -11.43,7.62 ; -0.5,0 0,0 ; 0,-0.5 0,0 ; 0,0.5 0,0 ; 0.5,0 0,0 ; 8.39,-7.62 8.89,-7.62 ; 8.39,7.62 8.89,7.62 ; 8.89,-8.12 8.89,-7.62 ; 8.89,-7.12 8.89,-7.62 ; 8.89,7.12 8.89,7.62 ; 8.89,8.12 8.89,7.62 ; 9.39,-7.62 8.89,-7.62 ; 9.39,7.62 8.89,7.62 ; 10.93,-7.62 11.43,-7.62 ; 11.43,-8.12 11.43,-7.62 ; 11.43,-7.12 11.43,-7.62 ; 11.93,-7.62 11.43,-7.62 ; 13.47,-7.62 13.97,-7.62 ; 13.47,7.62 13.97,7.62 ; 13.97,-8.12 13.97,-7.62 ; 13.97,-7.12 13.97,-7.62 ; 13.97,7.12 13.97,7.62 ; 13.97,8.12 13.97,7.62 ; 14.47,-7.62 13.97,-7.62 ; 14.47,7.62 13.97,7.62
Mechanical 14:
  lines w0.1: -16.125,-9.125 ccw(c-15.125,-9.125) -15.125,-10.125 15.125,-10.125 ccw(c15.125,-9.125) 16.125,-9.125 16.125,9.125 ccw(c15.125,9.125) 15.125,10.125 -15.125,10.125 ccw(c-15.125,9.125) -16.125,9.125 -16.125,-9.125
  text "24" at -13.335,3.81 h1.2
  text "13" at 14.605,3.81 h1.2
  text "12" at 14.605,-5.715 h1.2
  text "1" at -13.335,-5.715 h1.2
3D body "DCDC_TRACO_THI2.stp": height 10.25, standoff -3.8, extent -16.125,-10.125 16.125,10.125

## DCDC_TRACO_THL10 [mm] "THL 10 Series , Body 25.4x25.4mm, Height 10.6mm"
height 10.6
pads (5):
  round 2 hole 1.3: 1(-2.54,10.16) 2(2.54,10.16) 3(-10.16,-10.16) 4(0,-10.16) 5(10.16,-10.16)
Top Overlay:
  lines w0.2: -13.2,-11.95 ccw(c-11.95,-11.95) -11.95,-13.2 11.95,-13.2 ccw(c11.95,-11.95) 13.2,-11.95 13.2,11.95 ccw(c11.95,11.95) 11.95,13.2 -11.95,13.2 ccw(c-11.95,11.95) -13.2,11.95 -13.2,-11.95
  text "3" at -10.643,-8.756 h1.2
  text "4" at -0.483,-8.756 h1.2
  text "5" at 9.677,-8.756 h1.2
  text "2" at 2.261,7.486 h1.2
  text "1" at -2.819,7.486 h1.2
Notvisible:
  lines w0.1: -10.66,-10.16 -10.16,-10.16 ; -10.16,-10.66 -10.16,-10.16 ; -10.16,-9.66 -10.16,-10.16 ; -9.66,-10.16 -10.16,-10.16 ; -3.04,10.16 -2.54,10.16 ; -2.54,9.66 -2.54,10.16 ; -2.54,10.66 -2.54,10.16 ; -2.04,10.16 -2.54,10.16 ; -0.5,-10.16 0,-10.16 ; -0.5,0 0,0 ; 0,-10.66 0,-10.16 ; 0,-9.66 0,-10.16 ; 0,-0.5 0,0 ; 0,0.5 0,0 ; 0.5,-10.16 0,-10.16 ; 0.5,0 0,0 ; 2.04,10.16 2.54,10.16 ; 2.54,9.66 2.54,10.16 ; 2.54,10.66 2.54,10.16 ; 3.04,10.16 2.54,10.16 ; 9.66,-10.16 10.16,-10.16 ; 10.16,-10.66 10.16,-10.16 ; 10.16,-9.66 10.16,-10.16 ; 10.66,-10.16 10.16,-10.16
Mechanical 14:
  lines w0.1: -13.2,-11.95 ccw(c-11.95,-11.95) -11.95,-13.2 11.95,-13.2 ccw(c11.95,-11.95) 13.2,-11.95 13.2,11.95 ccw(c11.95,11.95) 11.95,13.2 -11.95,13.2 ccw(c-11.95,11.95) -13.2,11.95 -13.2,-11.95
  text "3" at -10.643,-8.756 h1.2
  text "4" at -0.483,-8.756 h1.2
  text "5" at 9.677,-8.756 h1.2
  text "2" at 2.261,7.486 h1.2
  text "1" at -2.819,7.486 h1.2
3D body "DCDC_TRACO_THL10.stp": height 10.6, standoff -3.6, extent -13.2,-13.2 13.2,13.2

## DCDC_TRACO_THL20WI [mm] "THL 20WI Series , Body 25.4x25.4mm, Height 10.7mm"
height 10.7
pads (6):
  round 2 hole 1.3: 1(-2.54,10.16) 2(2.54,10.16) 3(-10.16,-10.16) 4(0,-10.16) 5(10.16,-10.16) 6(10.16,10.16)
Top Overlay:
  lines w0.2: -12.95,-11.7 ccw(c-11.7,-11.7) -11.7,-12.95 11.7,-12.95 ccw(c11.7,-11.7) 12.95,-11.7 12.95,11.7 ccw(c11.7,11.7) 11.7,12.95 -11.7,12.95 ccw(c-11.7,11.7) -12.95,11.7 -12.95,-11.7
  text "3" at -10.643,-8.756 h1.2
  text "4" at -0.483,-8.756 h1.2
  text "5" at 9.677,-8.756 h1.2
  text "6" at 9.881,7.486 h1.2
  text "2" at 2.261,7.486 h1.2
  text "1" at -2.819,7.486 h1.2
Notvisible:
  lines w0.1: -10.66,-10.16 -10.16,-10.16 ; -10.16,-10.66 -10.16,-10.16 ; -10.16,-9.66 -10.16,-10.16 ; -9.66,-10.16 -10.16,-10.16 ; -3.04,10.16 -2.54,10.16 ; -2.54,9.66 -2.54,10.16 ; -2.54,10.66 -2.54,10.16 ; -2.04,10.16 -2.54,10.16 ; -0.5,-10.16 0,-10.16 ; -0.5,0 0,0 ; 0,-10.66 0,-10.16 ; 0,-9.66 0,-10.16 ; 0,-0.5 0,0 ; 0,0.5 0,0 ; 0.5,-10.16 0,-10.16 ; 0.5,0 0,0 ; 2.04,10.16 2.54,10.16 ; 2.54,9.66 2.54,10.16 ; 2.54,10.66 2.54,10.16 ; 3.04,10.16 2.54,10.16 ; 9.66,-10.16 10.16,-10.16 ; 9.66,10.16 10.16,10.16 ; 10.16,-10.66 10.16,-10.16 ; 10.16,-9.66 10.16,-10.16 ; 10.16,9.66 10.16,10.16 ; 10.16,10.66 10.16,10.16 ; 10.66,-10.16 10.16,-10.16 ; 10.66,10.16 10.16,10.16
Mechanical 14:
  lines w0.1: -12.95,-11.7 ccw(c-11.7,-11.7) -11.7,-12.95 11.7,-12.95 ccw(c11.7,-11.7) 12.95,-11.7 12.95,11.7 ccw(c11.7,11.7) 11.7,12.95 -11.7,12.95 ccw(c-11.7,11.7) -12.95,11.7 -12.95,-11.7
  text "3" at -10.643,-8.756 h1.2
  text "4" at -0.483,-8.756 h1.2
  text "5" at 9.677,-8.756 h1.2
  text "6" at 9.881,7.486 h1.2
  text "2" at 2.261,7.486 h1.2
  text "1" at -2.819,7.486 h1.2
3D body "DCDC_TRACO_THL20WI.stp": height 10.7, standoff -3.6, extent -12.95,-12.95 12.95,12.95